# Altium footprint library Custom_Library.PcbLib: 221 footprints (part 8 of 14)
Each footprint in its own frame and in the unit in brackets; x right, y up, seen from the top. Pads: shape width x height; smd on the part's side, far side on the other; paste and mask are expansions set on the pad; w line width, h text height; cw(c..) or ccw(c..) is an arc to the next point about the centre after c.
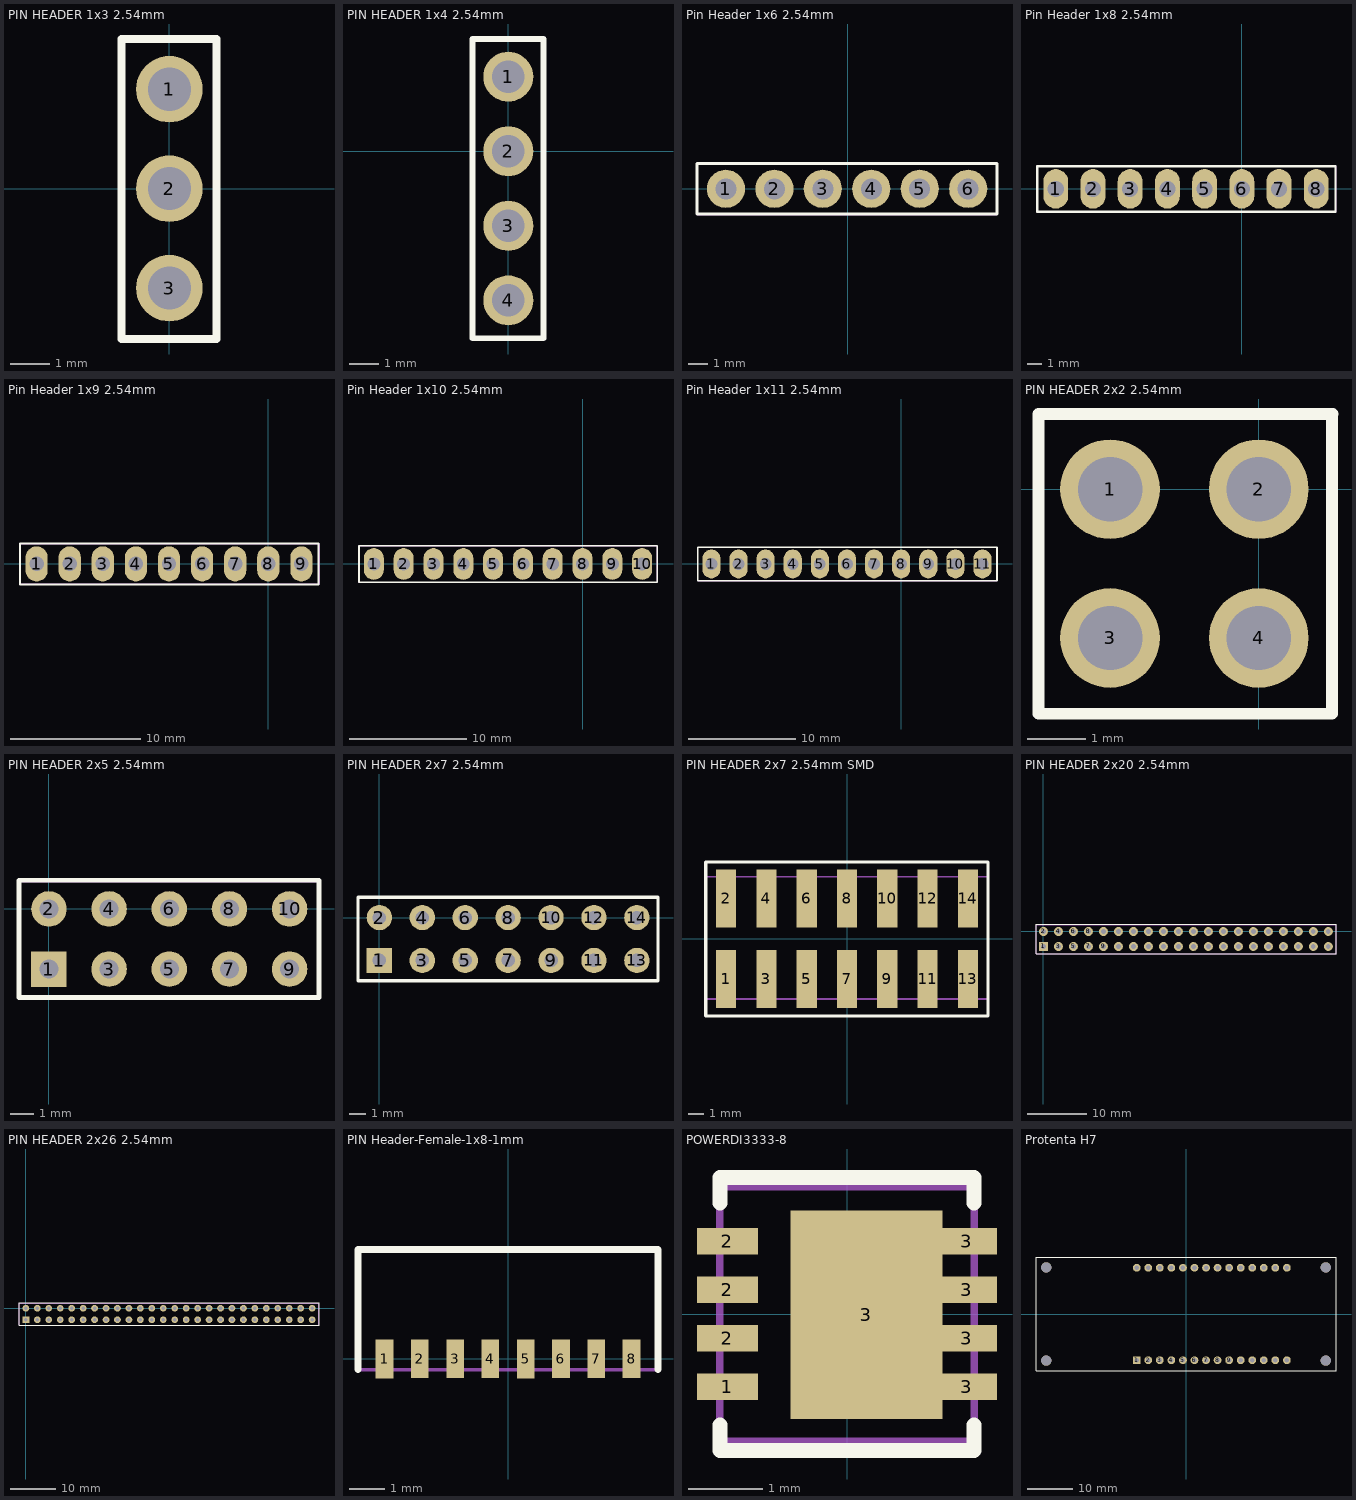
[diagram p7: the footprints below, top view; thin cyan lines are the x and y axes]

## PIN HEADER 1x3 2.54mm [mm]
pads (3):
  round 1.7 hole 1.1: 1(0,2.54) 2(0,0) 3(0,-2.54)
Top Overlay:
  lines w0.2: -1.221,-3.838 1.2,-3.838 1.2,3.823 -1.221,3.823 -1.221,-3.838
Top Assembly:
  lines w0.1: -1.207,-3.838 1.158,-3.838 1.158,3.817 -1.207,3.817 -1.207,-3.838
  text "'.Designator'" at -3.223,-5.112 h1.27
3D body "1x3 TH Vert 100mil.STEP": height 8.38, standoff -3.3, extent -1.276,-3.819 1.264,3.801

## PIN HEADER 1x4 2.54mm [mm]
pads (4):
  round 1.7 hole 1.1: 1(0,2.54) 2(0,0) 3(0,-2.54) 4(0,-5.08)
Top Overlay:
  lines w0.2: -1.221,-6.368 1.2,-6.368 1.2,3.823 -1.221,3.823 -1.221,-6.368
Top Assembly:
  lines w0.1: -1.207,-6.396 1.158,-6.396 1.158,3.817 -1.207,3.817 -1.207,-6.396
  text "'.Designator'" at -2.54,-7.62 h1.27

## Pin Header 1x6 2.54mm [mm]
pads (6):
  rrect100% 2x2 hole 1.1 mask+0.1: 1(-6.4,0) 2(-3.86,0) 3(-1.32,0) 4(1.22,0) 5(3.76,0) 6(6.3,0)
Top Overlay:
  lines w0.15: -7.914,-1.329 -7.914,1.319 7.811,1.319 7.811,-1.329 -7.914,-1.329
Top Assembly:
  lines w0.1: -7.9,-1.338 -7.9,1.293 7.797,1.293 7.797,-1.338 -7.9,-1.338
  text "'.Designator'" at -3.484,-2.752 h1.27

## Pin Header 1x8 2.54mm [mm]
pads (8):
  rrect100% 1.7x2.7 hole 1.1 mask+0.1: 1(-12.7,0) 2(-10.16,0) 3(-7.62,0) 4(-5.08,0) 5(-2.54,0) 6(0,0) 7(2.54,0) 8(5.08,0)
Top Overlay:
  lines w0.15: -13.97,-1.563 6.4,-1.563 6.4,1.55 -13.97,1.55 -13.97,-1.563
Top Assembly:
  lines w0.1: -13.97,-1.578 6.4,-1.578 6.4,1.565 -13.97,1.565 -13.97,-1.578
  text "'.Designator'" at -7.393,-2.686 h1.27

## Pin Header 1x9 2.54mm [mm]
pads (9):
  rrect100% 1.7x2.7 hole 1.1 mask+0.1: 1(-17.78,0) 2(-15.24,0) 3(-12.7,0) 4(-10.16,0) 5(-7.62,0) 6(-5.08,0) 7(-2.54,0) 8(0,0) 9(2.54,0)
Top Overlay:
  lines w0.15: -19.05,-1.563 -19.05,1.55 3.86,1.55 3.86,-1.563 -19.05,-1.563
Top Assembly:
  lines w0.1: -19.05,-1.578 -19.05,1.565 3.891,1.565 3.891,-1.578 -19.05,-1.578
  text "'.Designator'" at -10.182,-2.598 h1.27

## Pin Header 1x10 2.54mm [mm]
pads (10):
  rrect100% 1.7x2.7 hole 1.1 mask+0.1: 1(-17.78,0) 2(-15.24,0) 3(-12.7,0) 4(-10.16,0) 5(-7.62,0) 6(-5.08,0) 7(-2.54,0) 8(0,0) 9(2.54,0) 10(5.08,0)
Top Overlay:
  lines w0.15: -19.05,-1.563 -19.05,1.55 6.366,1.55 6.366,-1.563 -19.05,-1.563
Top Assembly:
  lines w0.1: -19.05,-1.578 -19.05,1.565 6.366,1.565 6.366,-1.578 -19.05,-1.578
  text "'.Designator'" at -9.715,-2.547 h1.27

## Pin Header 1x11 2.54mm [mm]
pads (11):
  rrect100% 1.7x2.7 hole 1.1 mask+0.1: 1(-17.78,0) 2(-15.24,0) 3(-12.7,0) 4(-10.16,0) 5(-7.62,0) 6(-5.08,0) 7(-2.54,0) 8(0,0) 9(2.54,0) 10(5.08,0) 11(7.62,0)
Top Overlay:
  lines w0.15: -19.05,-1.563 8.979,-1.563 8.979,1.55 -19.05,1.55 -19.05,-1.563
Top Assembly:
  lines w0.1: -19.05,-1.578 8.963,-1.578 8.963,1.565 -19.05,1.565 -19.05,-1.578
  text "'.Designator'" at -9.715,-2.547 h1.27

## PIN HEADER 2x2 2.54mm [mm]
pads (4):
  round 1.7 hole 1.1: 1(-2.54,0) 2(0,0) 3(-2.54,-2.54) 4(0,-2.54)
Top Overlay:
  lines w0.2: 1.25,1.283 1.25,-3.831 -3.761,-3.831 -3.761,1.283 1.26,1.283
Top Assembly:
  lines w0.1: 1.263,1.277 1.263,-3.837 -3.747,-3.837 -3.747,1.277 1.274,1.277
  text "'.Designator'" at -4,-5.1 h1.27
3D body "PH2-04-UA.STEP": height 8.55, standoff -3, extent -3.759,-3.811 1.241,1.269

## PIN HEADER 2x5 2.54mm [mm]
pads (10):
  rect 1.5x1.5 hole 0.8: 1(0,-2.54)
  round 1.5 hole 0.8: 2(0,0) 3(2.54,-2.54) 4(2.54,0) 5(5.08,-2.54) 6(5.08,0) 7(7.62,-2.54) 8(7.62,0) 9(10.16,-2.54) 10(10.16,0)
Top Overlay:
  lines w0.2: -1.264,-3.745 11.4,-3.745 11.4,1.205 -1.264,1.205 -1.264,-3.745
Top Assembly:
  lines w0.1: -1.257,-3.747 -1.257,1.162 11.4,1.162 11.4,-3.747 -1.257,-3.747
  text "'.Designator'" at 1.826,-4.911 h1.27
3D body "TSW-105-05-G-D.stp": height 5.26, standoff -3.25, extent -1.3,-3.84 11.4,1.24

## PIN HEADER 2x7 2.54mm [mm]
pads (14):
  rect 1.5x1.5 hole 0.8: 1(0,-2.54)
  round 1.5 hole 0.8: 2(0,0) 3(2.54,-2.54) 4(2.54,0) 5(5.08,-2.54) 6(5.08,0) 7(7.62,-2.54) 8(7.62,0) 9(10.16,-2.54) 10(10.16,0) 11(12.7,-2.54) 12(12.7,0) 13(15.24,-2.54) 14(15.24,0)
Top Overlay:
  lines w0.2: -1.264,-3.745 16.49,-3.745 16.49,1.205 -1.264,1.205 -1.264,-3.745
Top Assembly:
  lines w0.1: -1.257,-3.747 -1.257,1.162 16.477,1.162 16.477,-3.747 -1.257,-3.747
  text "'.Designator'" at 4,-5.3 h1.27
3D body "1x7 TH Vert 100mil.STEP": height 8.48, standoff -3.2, extent -1.27,-3.81 16.51,-1.27
3D body "1x7 TH Vert 100mil.STEP": height 8.48, standoff -3.2, extent -1.271,-1.267 16.509,1.273

## PIN HEADER 2x7 2.54mm SMD [mm]
pads (14):
  rect 1.27x3.68 smd: 1(-7.62,-2.54) 2(-7.62,2.54) 3(-5.08,-2.54) 4(-5.08,2.54) 5(-2.54,-2.54) 6(-2.54,2.54) 7(0,-2.54) 8(0,2.54) 9(2.54,-2.54) 10(2.54,2.54) 11(5.08,-2.54) 12(5.08,2.54) 13(7.62,-2.54) 14(7.62,2.54)
Top Overlay:
  lines w0.2: -8.906,-4.869 -8.906,4.832 8.899,4.832 8.899,-4.869 -8.906,-4.869
Top Assembly:
  lines w0.1: -8.9,-3.8 8.883,-3.8 8.883,3.9 -6.2,3.9 -8.9,3.9 -8.9,-3.8
  text "'.Designator'" at -3.165,5.5 h1.27
3D body "tsm-107-01-l-dv-p.STEP": height 9.63, standoff -0.02, extent -8.89,-3.796 8.89,3.9

## PIN HEADER 2x20 2.54mm [mm]
pads (40):
  rect 1.5x1.5 hole 0.8: 1(0,-2.54)
  round 1.5 hole 0.8: 2(0,0) 3(2.54,-2.54) 4(2.54,0) 5(5.08,-2.54) 6(5.08,0) 7(7.62,-2.54) 8(7.62,0) 9(10.16,-2.54) 10(10.16,0) 11(12.7,-2.54) 12(12.7,0) 13(15.24,-2.54) 14(15.24,0) 15(17.78,-2.54) 16(17.78,0) 17(20.32,-2.54) 18(20.32,0) 19(22.86,-2.54) 20(22.86,0) 21(25.4,-2.54) 22(25.4,0) 23(27.94,-2.54) 24(27.94,0) 25(30.48,-2.54) 26(30.48,0) 27(33.02,-2.54) 28(33.02,0) 29(35.56,-2.54) 30(35.56,0) 31(38.1,-2.54) 32(38.1,0) 33(40.64,-2.54) 34(40.64,0) 35(43.18,-2.54) 36(43.18,0) 37(45.72,-2.54) 38(45.72,0) 39(48.26,-2.54) 40(48.26,0)
Top Overlay:
  lines w0.2: -1.264,-3.745 49.552,-3.745 49.552,1.205 -1.264,1.205 -1.264,-3.745
Top Assembly:
  lines w0.1: -1.222,-3.747 -1.222,1.162 49.552,1.162 49.552,-3.747 -1.222,-3.747
  text "'.Designator'" at 21.1,-5.5 h1.27
3D body "TSW-120-15-T-D.STEP": height 7.4, standoff -2.78, extent -1.271,-3.809 49.529,1.271

## PIN HEADER 2x26 2.54mm [mm]
pads (52):
  rect 1.5x1.5 hole 0.8: 01(0,-2.54)
  round 1.5 hole 0.8: 02(0,0) 03(2.54,-2.54) 04(2.54,0) 05(5.08,-2.54) 06(5.08,0) 07(7.62,-2.54) 08(7.62,0) 09(10.16,-2.54) 10(10.16,0) 11(12.7,-2.54) 12(12.7,0) 13(15.24,-2.54) 14(15.24,0) 15(17.78,-2.54) 16(17.78,0) 17(20.32,-2.54) 18(20.32,0) 19(22.86,-2.54) 20(22.86,0) 21(25.4,-2.54) 22(25.4,0) 23(27.94,-2.54) 24(27.94,0) 25(30.48,-2.54) 26(30.48,0) 27(33.02,-2.54) 28(33.02,0) 29(35.56,-2.54) 30(35.56,0) 31(38.1,-2.54) 32(38.1,0) 33(40.64,-2.54) 34(40.64,0) 35(43.18,-2.54) 36(43.18,0) 37(45.72,-2.54) 38(45.72,0) 39(48.26,-2.54) 40(48.26,0) 41(50.8,-2.54) 42(50.8,0) 43(53.34,-2.54) 44(53.34,0) 45(55.88,-2.54) 46(55.88,0) 47(58.42,-2.54) 48(58.42,0) 49(60.96,-2.54) 50(60.96,0) 51(63.5,-2.54) 52(63.5,0)
Top Overlay:
  lines w0.2: -1.525,-3.745 65.025,-3.745 65.025,1.205 -1.525,1.205 -1.525,-3.745
Top Assembly:
  lines w0.2: -1.504,-3.747 -1.504,1.162 65.017,1.162 65.017,-3.747 -1.504,-3.747
  text "'.Designator'" at 28.995,-5.023 h1.27
3D body "ESQ_126_39_G_D.STEP": height 11.21, standoff -2.47, extent -1.521,-3.812 65.027,1.268

## PIN Header-Female-1x8-1mm [mm]
pads (8):
  rect 0.5x1.1 smd mask+0.05: 1(-3.5,-0.004) 2(-2.5,0.004) 3(-1.5,0.004) 4(-0.5,0.004) 5(0.5,-0.004) 6(1.5,0.004) 7(2.5,0.004) 8(3.5,0.004)
Top Overlay:
  lines w0.2: -4.251,-0.304 -4.251,3.096 -2.9,3.096 4.25,3.096 4.25,-0.304
Top Assembly:
  lines w0.1: -4.251,-0.304 4.25,-0.304 4.25,3.096 1.681,3.096 -4.251,3.096 -4.251,-0.304
  text "'.Designator'" at -3.305,1.473 h1.27
3D body "BC075-08-A-L-A.stp": height 1.51, standoff 0.01, extent -4.25,-0.304 4.25,3.096

## POWERDI3333-8 [mil]
pads (9):
  rect 32x14 smd: 1(-63,-38.39) 2(-63,-12.8) 2(-63,12.8) 2(-63,38.39) 3(63,-38.39) 3(63,-12.8) 3(63,12.8) 3(63,38.39)
  rect 80x110 smd: 3(10.24,-0.38)
Top Overlay:
  lines w7.87: -67,-58.49 -67,-72 67,-72 67,-58.49 ; -67,58.49 -67,72 67,72 67,58.49
Top Assembly:
  lines w3.94: -66.93,-66.93 -66.93,66.93 3.94,66.93 66.93,66.93 66.93,-66.93 -66.93,-66.93
  text "'.Designator'" at -130.51,-123.76 h50
3D body "POWERDI3333-8_UX_DIO.step": height 33.11, standoff 0, extent -66.93,-67.09 67.09,66.93

## Protenta H7 [mm]
pads (32):
  rect 1.7x1.7 hole 1: 1(-10.835,-10.16)
  round 1.7 hole 1: 2(-8.295,-10.16) 3(-5.755,-10.16) 4(-3.215,-10.16) 5(-0.675,-10.16) 6(1.865,-10.16) 7(4.405,-10.16) 8(6.945,-10.16) 9(9.485,-10.16) 10(12.025,-10.16) 11(14.565,-10.16) 12(17.105,-10.16) 13(19.645,-10.16) 14(22.185,-10.16) 15(22.185,10.16) 16(19.645,10.16) 17(17.105,10.16) 18(14.565,10.16) 19(12.025,10.16) 20(9.485,10.16) 21(6.945,10.16) 22(4.405,10.16) 23(1.865,10.16) 24(-0.675,10.16) 25(-3.215,10.16) 26(-5.755,10.16) 27(-8.295,10.16) 28(-10.835,10.16)
  round 2.25 hole 2.25 unplated: ""(-30.74,-10.25) ""(-30.74,10.25) ""(30.74,-10.25) ""(30.74,10.25)
Top Overlay:
  lines w0.2: -32.99,-12.5 -32.99,-4.05 -32.99,4.05 -32.99,12.5 ; -32.97,-12.5 32.99,-12.5 32.99,-5.8 32.99,5.2 32.99,12.5 -32.97,12.5